# Altium footprint library SparkFun.PCBLIB: 674 footprints (part 25 of 44)
Each footprint in its own frame and in the unit in brackets; x right, y up, seen from the top. Pads: shape width x height; smd on the part's side, far side on the other; paste and mask are expansions set on the pad; w line width, h text height; cw(c..) or ccw(c..) is an arc to the next point about the centre after c.
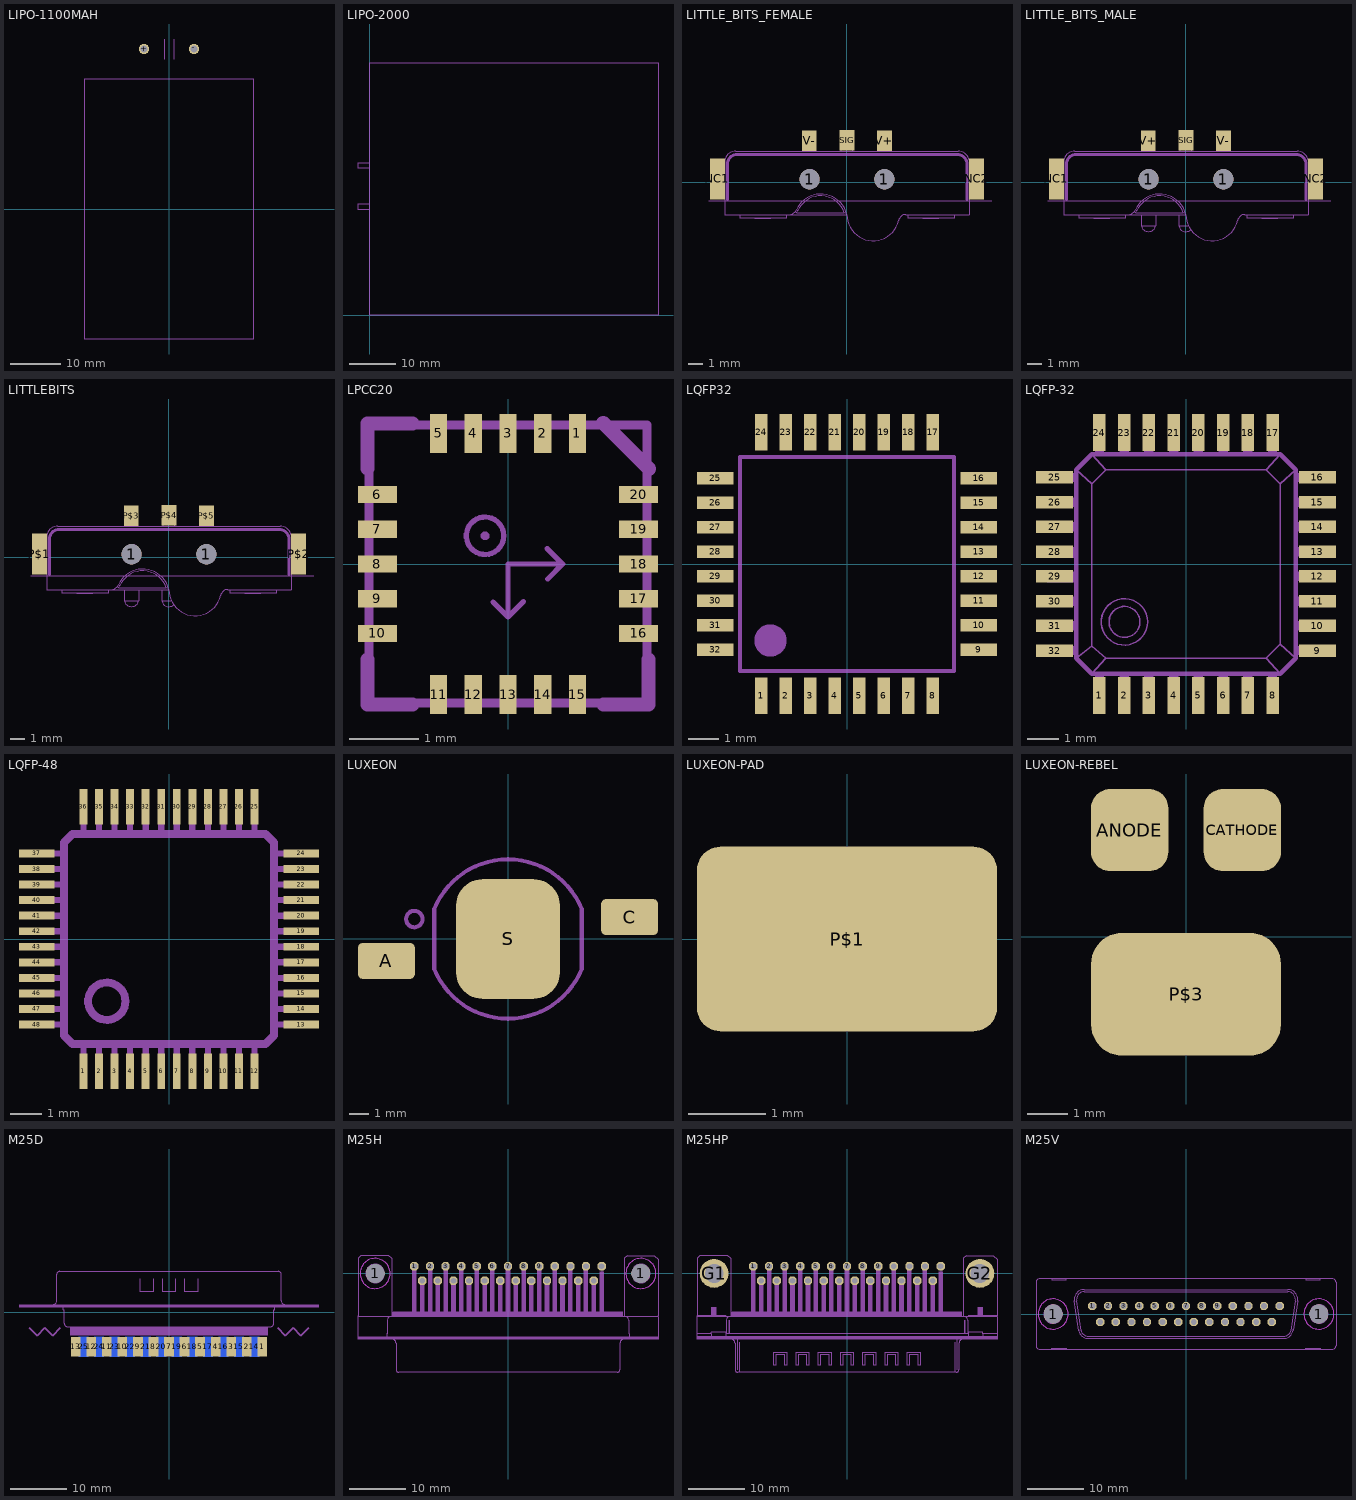
[diagram p24: the footprints below, top view; thin cyan lines are the x and y axes]

## LIPO-1100MAH [mil]
pads (2):
  round 82.5 hole 55: +(-196.85,1259.84) -(196.85,1259.84)
Mechanical 18:
  lines w5: -39.37,1181.1 -39.37,1338.58 ; 39.37,1181.1 39.37,1338.58
  lines w8: -669.29,-1023.62 669.29,-1023.62 669.29,1023.62 -669.29,1023.62 -669.29,-1023.62

## LIPO-2000 [mil]
Mechanical 18:
  lines w5: 0,900 0,0 2450,0 2450,2150 0,2150 0,1300 ; 0,900 0,950 ; 0,900 -100,900 -100,950 0,950 ; 0,950 0,1250 ; 0,1250 0,1300 ; 0,1250 -100,1250 -100,1300 0,1300

## LITTLE_BITS_FEMALE [mil]
pads (7):
  round 54.09 hole 54.09: 1(-99,8.5) 1(101,8.5)
  rect 40x109 smd: NC1(-346,9.5) NC2(348,9.5)
  rect 40x55 smd: SIG(1,112.5) V+(101,111.5) V-(-100,111.5)
Mechanical 2:
  lines w8: -319,-45.5 -319,49.5 cw(c-294,49.5) -294,74.5 297,74.5 cw(c297,49.5) 322,49.5 322,-45.5
Mechanical 18:
  circle w1: c-99.19,9.03 r25
  circle w1: c-99.19,9.03 r15
  circle w1: c100.82,9.03 r25
  circle w1: c100.82,9.03 r15
  lines w0: -369,-49.5 389,-49.5 ; -326.69,59.03 -326.69,-40.97 ; -286.69,-85.97 -286.69,-95.97 -161.69,-95.97 -161.69,-85.97 ; -245.85,-95.97 -245.85,-96.97 -204.19,-96.97 -204.19,-95.97 ; -236.48,-96.97 -236.48,-95.97 ; -210.43,-96.97 -210.43,-95.97 ; -137.44,-77.97 -133.44,-80.97 ; -114.19,84.03 -114.19,134.03 -84.19,134.03 -84.19,84.03 ; -14.19,84.03 -14.19,134.03 15.82,134.03 15.82,84.03 ; -1.41,-79.42 -5.87,-80.97 ; 0.83,-85.97 0.82,-85.97 ; 85.82,84.03 85.82,134.03 115.82,134.03 115.82,84.03 ; 328.32,-40.97 363.32,-40.97 363.32,-3.47 cw(c363.32,9.03) 363.32,21.53 363.32,59.03 328.32,59.03 ; -326.69,-40.97 -326.69,-85.97 -153.44,-85.97 ; -326.69,-40.97 -361.69,-40.97 -361.69,-3.47 ccw(c-361.69,9.03) -361.69,21.53 -361.69,59.03 -326.26,59.03 cw(c-296.68,54.04) -296.69,84.03 115.82,84.03 ; -153.44,-85.97 -18.69,-85.97 0.82,-85.97 ; -153.44,-85.97 ccw(c-153.44,-65.97) -135.13,-74.02 ; -135.13,-74.02 -130.56,-76.03 ; -135.13,-74.02 -135.14,-74.02 ; -135.14,-74.02 cw(c-69.18,-103.02) 0.82,-85.97 ; -133.44,-80.97 -5.87,-80.97 ; -133.44,-80.97 ccw(c-153.44,-66) -130.56,-76.03 ; -130.56,-76.03 cw(c-69.19,-103.02) -5.87,-80.97 ; 0.82,-85.97 ccw(c70.81,-85.97) 139.06,-101.52 cw(c158.57,-105.97) 158.57,-85.97 163.32,-85.97 ; 115.82,84.03 298.32,84.03 cw(c298.31,54.03) 327.9,59.03 328.32,59.03 ; 163.32,-85.97 288.32,-85.97 ; 163.32,-85.97 163.32,-95.97 204.15,-95.97 ; 204.15,-95.97 213.52,-95.97 ; 204.15,-95.97 204.15,-96.97 213.52,-96.97 ; 213.52,-96.97 239.57,-96.97 ; 213.52,-96.97 213.52,-95.97 ; 213.52,-95.97 239.57,-95.97 ; 239.57,-96.97 245.82,-96.97 245.82,-95.97 ; 239.57,-96.97 239.57,-95.97 ; 239.57,-95.97 245.82,-95.97 ; 245.82,-95.97 288.32,-95.97 288.32,-85.97 ; 288.32,-85.97 328.32,-85.97 328.32,59.03

## LITTLE_BITS_MALE [mil]
pads (7):
  round 54.09 hole 54.09: 1(-99,8.5) 1(101,8.5)
  rect 40x109 smd: NC1(-346,9.5) NC2(348,9.5)
  rect 40x55 smd: SIG(1,112.5) V+(-100,111.5) V-(101,111.5)
Mechanical 2:
  lines w8: -319,-45.5 -319,49.5 cw(c-294,49.5) -294,74.5 297,74.5 cw(c297,49.5) 322,49.5 322,-45.5
Mechanical 18:
  circle w1: c-99.19,9.03 r25
  circle w1: c-99.19,9.03 r15
  circle w1: c100.82,9.03 r25
  circle w1: c100.82,9.03 r15
  lines w0: -369,-49.5 389,-49.5 ; -326.69,59.03 -326.69,-40.97 ; -286.69,-85.97 -286.69,-95.97 -161.69,-95.97 -161.69,-85.97 ; -245.85,-95.97 -245.85,-96.97 -204.19,-96.97 -204.19,-95.97 ; -236.48,-96.97 -236.48,-95.97 ; -210.43,-96.97 -210.43,-95.97 ; -137.44,-77.97 -133.44,-80.97 ; -118.69,-85.97 -118.69,-115.97 ; -114.19,84.03 -114.19,134.03 -84.19,134.03 -84.19,84.03 ; -79.69,-85.97 -79.69,-115.97 ; -14.19,84.03 -14.19,134.03 15.82,134.03 15.82,84.03 ; -1.41,-79.42 -5.87,-80.97 ; 0.83,-85.97 0.82,-85.97 ; 7.64,-115.97 -18.69,-115.97 ; 13.94,-126.62 cw(c0.81,-111.52) -18.69,-115.97 ; 85.82,84.03 85.82,134.03 115.82,134.03 115.82,84.03 ; 328.32,-40.97 363.32,-40.97 363.32,-3.47 cw(c363.32,9.03) 363.32,21.53 363.32,59.03 328.32,59.03 ; -326.69,-40.97 -326.69,-85.97 -153.44,-85.97 ; -326.69,-40.97 -361.69,-40.97 -361.69,-3.47 ccw(c-361.69,9.03) -361.69,21.53 -361.69,59.03 -326.26,59.03 cw(c-296.68,54.04) -296.69,84.03 115.82,84.03 ; -153.44,-85.97 -18.69,-85.97 ; -153.44,-85.97 ccw(c-153.44,-65.97) -135.13,-74.02 ; -135.13,-74.02 -130.56,-76.03 ; -135.13,-74.02 -135.14,-74.02 ; -135.14,-74.02 cw(c-69.18,-103.02) 0.82,-85.97 ; -133.44,-80.97 -5.87,-80.97 ; -133.44,-80.97 ccw(c-153.44,-66) -130.56,-76.03 ; -130.56,-76.03 cw(c-69.19,-103.02) -5.87,-80.97 ; -118.69,-115.97 -79.69,-115.97 ; -118.69,-115.97 ccw(c-99.19,-111.53) -79.69,-115.97 ; -18.69,-115.97 -18.69,-85.97 ; -18.69,-85.97 0.82,-85.97 ; 0.82,-85.97 ccw(c70.81,-85.97) 139.06,-101.52 cw(c158.57,-105.97) 158.57,-85.97 163.32,-85.97 ; 115.82,84.03 298.32,84.03 cw(c298.31,54.03) 327.9,59.03 328.32,59.03 ; 163.32,-85.97 288.32,-85.97 ; 163.32,-85.97 163.32,-95.97 204.15,-95.97 ; 204.15,-95.97 213.52,-95.97 ; 204.15,-95.97 204.15,-96.97 213.52,-96.97 ; 213.52,-96.97 239.57,-96.97 ; 213.52,-96.97 213.52,-95.97 ; 213.52,-95.97 239.57,-95.97 ; 239.57,-96.97 245.82,-96.97 245.82,-95.97 ; 239.57,-96.97 239.57,-95.97 ; 239.57,-95.97 245.82,-95.97 ; 245.82,-95.97 288.32,-95.97 288.32,-85.97 ; 288.32,-85.97 328.32,-85.97 328.32,59.03

## LITTLEBITS [mil]
pads (7):
  round 54.09 hole 54.09: 1(-99,8.5) 1(101,8.5)
  rect 40x109 smd: P$1(-346,9.5) P$2(348,9.5)
  rect 40x55 smd: P$3(-100,111.5) P$4(1,112.5) P$5(101,111.5)
Mechanical 2:
  lines w8: -319,-45.5 -319,49.5 cw(c-294,49.5) -294,74.5 297,74.5 cw(c297,49.5) 322,49.5 322,-45.5
Mechanical 18:
  circle w1: c-99.19,9.03 r25
  circle w1: c-99.19,9.03 r15
  circle w1: c100.82,9.03 r25
  circle w1: c100.82,9.03 r15
  lines w0: -369,-49.5 389,-49.5 ; -326.69,59.03 -326.69,-40.97 ; -286.69,-85.97 -286.69,-95.97 -161.69,-95.97 -161.69,-85.97 ; -245.85,-95.97 -245.85,-96.97 -204.19,-96.97 -204.19,-95.97 ; -236.48,-96.97 -236.48,-95.97 ; -210.43,-96.97 -210.43,-95.97 ; -137.44,-77.97 -133.44,-80.97 ; -118.69,-85.97 -118.69,-115.97 ; -114.19,84.03 -114.19,134.03 -84.19,134.03 -84.19,84.03 ; -79.69,-85.97 -79.69,-115.97 ; -14.19,84.03 -14.19,134.03 15.82,134.03 15.82,84.03 ; -1.41,-79.42 -5.87,-80.97 ; 0.83,-85.97 0.82,-85.97 ; 7.64,-115.97 -18.69,-115.97 ; 13.94,-126.62 cw(c0.81,-111.52) -18.69,-115.97 ; 85.82,84.03 85.82,134.03 115.82,134.03 115.82,84.03 ; 328.32,-40.97 363.32,-40.97 363.32,-3.47 cw(c363.32,9.03) 363.32,21.53 363.32,59.03 328.32,59.03 ; -326.69,-40.97 -326.69,-85.97 -153.44,-85.97 ; -326.69,-40.97 -361.69,-40.97 -361.69,-3.47 ccw(c-361.69,9.03) -361.69,21.53 -361.69,59.03 -326.26,59.03 cw(c-296.68,54.04) -296.69,84.03 115.82,84.03 ; -153.44,-85.97 -18.69,-85.97 ; -153.44,-85.97 ccw(c-153.44,-65.97) -135.13,-74.02 ; -135.13,-74.02 -130.56,-76.03 ; -135.13,-74.02 -135.14,-74.02 ; -135.14,-74.02 cw(c-69.18,-103.02) 0.82,-85.97 ; -133.44,-80.97 -5.87,-80.97 ; -133.44,-80.97 ccw(c-153.44,-66) -130.56,-76.03 ; -130.56,-76.03 cw(c-69.19,-103.02) -5.87,-80.97 ; -118.69,-115.97 -79.69,-115.97 ; -118.69,-115.97 ccw(c-99.19,-111.53) -79.69,-115.97 ; -18.69,-115.97 -18.69,-85.97 ; -18.69,-85.97 0.82,-85.97 ; 0.82,-85.97 ccw(c70.81,-85.97) 139.06,-101.52 cw(c158.57,-105.97) 158.57,-85.97 163.32,-85.97 ; 115.82,84.03 298.32,84.03 cw(c298.31,54.03) 327.9,59.03 328.32,59.03 ; 163.32,-85.97 288.32,-85.97 ; 163.32,-85.97 163.32,-95.97 204.15,-95.97 ; 204.15,-95.97 213.52,-95.97 ; 204.15,-95.97 204.15,-96.97 213.52,-96.97 ; 213.52,-96.97 239.57,-96.97 ; 213.52,-96.97 213.52,-95.97 ; 213.52,-95.97 239.57,-95.97 ; 239.57,-96.97 245.82,-96.97 245.82,-95.97 ; 239.57,-96.97 239.57,-95.97 ; 239.57,-95.97 245.82,-95.97 ; 245.82,-95.97 288.32,-95.97 288.32,-85.97 ; 288.32,-85.97 328.32,-85.97 328.32,59.03

## LPCC20 [mm]
pads (20):
  rect 0.25x0.56 smd: 1(1,1.88) 2(0.5,1.88) 3(0,1.88) 4(-0.5,1.88) 5(-1,1.88) 11(-1,-1.88) 12(-0.5,-1.88) 13(0,-1.88) 14(0.5,-1.88) 15(1,-1.88)
  rect 0.56x0.25 smd: 6(-1.88,1) 7(-1.88,0.5) 8(-1.88,0) 9(-1.88,-0.5) 10(-1.88,-1) 16(1.88,-1) 17(1.88,-0.5) 18(1.88,0) 19(1.88,0.5) 20(1.88,1)
Mechanical 2:
  lines w0.203: -2.024,-1.375 -2.024,-2.024 -1.373,-2.024 ; -2.024,1.375 -2.024,2.024 -1.375,2.024 ; 1.372,2.032 2.032,1.372 ; 1.375,-2.024 2.024,-2.024 2.024,-1.375
Mechanical 18:
  circle w0.076: c-0.33,0.406 r0.27
  circle w0.076: c-0.33,0.406 r0.025
  lines w0.076: -0.216,-0.546 0,-0.762 ; 0.223,-0.539 0,-0.762 ; 0.564,0.223 0.787,0 ; 0.572,-0.215 0.787,0 ; 0,-0.762 0,0 0.787,0
  lines w0.127: -2,-2 2,-2 2,2 -2,2 -2,-2

## LQFP32 [mm]
pads (32):
  rect 0.4x1.2 smd: 1(-2.8,-4.3) 2(-2,-4.3) 3(-1.2,-4.3) 4(-0.4,-4.3) 5(0.4,-4.3) 6(1.2,-4.3) 7(2,-4.3) 8(2.8,-4.3) 17(2.8,4.3) 18(2,4.3) 19(1.2,4.3) 20(0.4,4.3) 21(-0.4,4.3) 22(-1.2,4.3) 23(-2,4.3) 24(-2.8,4.3)
  rect 1.2x0.4 smd: 9(4.3,-2.8) 10(4.3,-2) 11(4.3,-1.2) 12(4.3,-0.4) 13(4.3,0.4) 14(4.3,1.2) 15(4.3,2) 16(4.3,2.8) 25(-4.3,2.8) 26(-4.3,2) 27(-4.3,1.2) 28(-4.3,0.4) 29(-4.3,-0.4) 30(-4.3,-1.2) 31(-4.3,-2) 32(-4.3,-2.8)
Mechanical 2:
  lines w0.127: -3.5,-3.5 -3.5,3.5 3.5,3.5 3.5,-3.5 -3.5,-3.5
Mechanical 6:
  circle w0.61: c-2.5,-2.5 r0.224

## LQFP-32 [mm]
pads (32):
  rect 0.4x1.2 smd: 1(-2.8,-4.25) 2(-2,-4.25) 3(-1.2,-4.25) 4(-0.4,-4.25) 5(0.4,-4.25) 6(1.2,-4.25) 7(2,-4.25) 8(2.8,-4.25) 17(2.8,4.25) 18(2,4.25) 19(1.2,4.25) 20(0.4,4.25) 21(-0.4,4.25) 22(-1.2,4.25) 23(-2,4.25) 24(-2.8,4.25)
  rect 1.2x0.4 smd: 9(4.25,-2.8) 10(4.25,-2) 11(4.25,-1.2) 12(4.25,-0.4) 13(4.25,0.4) 14(4.25,1.2) 15(4.25,2) 16(4.25,2.8) 25(-4.25,2.8) 26(-4.25,2) 27(-4.25,1.2) 28(-4.25,0.4) 29(-4.25,-0.4) 30(-4.25,-1.2) 31(-4.25,-2) 32(-4.25,-2.8)
Mechanical 2:
  circle w0.051: c-1.99,-1.871 r0.75
  circle w0.051: c-1.99,-1.871 r0.5
  lines w0.051: -3.55,-3.05 -3.05,-2.65 ; -3.55,3.05 -3.05,2.59 ; -3.05,-3.55 -2.59,-3.05 ; -3.05,3.55 -2.59,3.05 ; 3.05,-3.55 2.59,-3.05 ; 3.05,3.55 2.59,3.05 ; 3.55,-3.05 3.05,-2.59 ; 3.55,3.05 3.05,2.59 ; -3.05,-2.65 -3.05,2.59 ; -3.05,-2.65 -2.59,-3.05 ; -3.05,2.59 -2.59,3.05 ; -2.59,-3.05 2.59,-3.05 ; -2.59,3.05 2.59,3.05 ; 2.59,-3.05 3.05,-2.59 ; 2.59,3.05 3.05,2.59 ; 3.05,-2.59 3.05,2.59
  lines w0.152: -3.55,-3.05 -3.05,-3.55 3.05,-3.55 3.55,-3.05 3.55,3.05 3.05,3.55 -3.05,3.55 -3.55,3.05 -3.55,-3.05
Mechanical 18:
  rectangle: -2.95,3.55 -2.65,4.5
  rectangle: -2.15,3.55 -1.85,4.5
  rectangle: -1.35,3.55 -1.05,4.5
  rectangle: -0.55,3.55 -0.25,4.5
  rectangle: 0.25,3.55 0.55,4.5
  rectangle: 1.05,3.55 1.35,4.5
  rectangle: 1.85,3.55 2.15,4.5
  rectangle: 2.65,3.55 2.95,4.5
  rectangle: 3.55,2.65 4.5,2.95
  rectangle: 3.55,1.85 4.5,2.15
  rectangle: 3.55,1.05 4.5,1.35
  rectangle: 3.55,0.25 4.5,0.55
  rectangle: 3.55,-0.55 4.5,-0.25
  rectangle: 3.55,-1.35 4.5,-1.05
  rectangle: 3.55,-2.15 4.5,-1.85
  rectangle: 3.55,-2.95 4.5,-2.65
  rectangle: 2.65,-4.5 2.95,-3.55
  rectangle: 1.85,-4.5 2.15,-3.55
  rectangle: 1.05,-4.5 1.35,-3.55
  rectangle: 0.25,-4.5 0.55,-3.55
  rectangle: -0.55,-4.5 -0.25,-3.55
  rectangle: -1.35,-4.5 -1.05,-3.55
  rectangle: -2.15,-4.5 -1.85,-3.55
  rectangle: -2.95,-4.5 -2.65,-3.55
  rectangle: -4.5,-2.95 -3.55,-2.65
  rectangle: -4.5,-2.15 -3.55,-1.85
  rectangle: -4.5,-1.35 -3.55,-1.05
  rectangle: -4.5,-0.6 -3.55,-0.25
  rectangle: -4.5,0.2 -3.55,0.55
  rectangle: -4.5,1.05 -3.55,1.35
  rectangle: -4.5,1.85 -3.55,2.15
  rectangle: -4.5,2.65 -3.55,2.95

## LQFP-48 [mil]
pads (48):
  rect 10x45 smd: 1(-108.27,-167.32) 2(-88.58,-167.32) 3(-68.9,-167.32) 4(-49.21,-167.32) 5(-29.53,-167.32) 6(-9.84,-167.32) 7(9.84,-167.32) 8(29.53,-167.32) 9(49.21,-167.32) 10(68.9,-167.32) 11(88.58,-167.32) 12(108.27,-167.32) 25(108.27,167.32) 26(88.58,167.32) 27(68.9,167.32) 28(49.21,167.32) 29(29.53,167.32) 30(9.84,167.32) 31(-9.84,167.32) 32(-29.53,167.32) 33(-49.21,167.32) 34(-68.9,167.32) 35(-88.58,167.32) 36(-108.27,167.32)
  rect 45x10 smd: 13(167.32,-108.27) 14(167.32,-88.58) 15(167.32,-68.9) 16(167.32,-49.21) 17(167.32,-29.53) 18(167.32,-9.84) 19(167.32,9.84) 20(167.32,29.53) 21(167.32,49.21) 22(167.32,68.9) 23(167.32,88.58) 24(167.32,108.27) 37(-167.32,108.27) 38(-167.32,88.58) 39(-167.32,68.9) 40(-167.32,49.21) 41(-167.32,29.53) 42(-167.32,9.84) 43(-167.32,-9.84) 44(-167.32,-29.53) 45(-167.32,-49.21) 46(-167.32,-68.9) 47(-167.32,-88.58) 48(-167.32,-108.27)
Mechanical 2:
  circle w10: c-78.74,-78.74 r23.62
  lines w10: -132.87,-122.05 -122.05,-132.87 122.05,-132.87 132.87,-122.05 132.87,122.05 122.05,132.87 -122.05,132.87 -132.87,122.05 -132.87,-122.05
Mechanical 18:
  rectangle: -112.2,-177.17 -104.33,-135.83
  rectangle: -92.52,-177.17 -84.65,-135.83
  rectangle: -72.83,-177.17 -64.96,-135.83
  rectangle: -53.15,-177.17 -45.28,-135.83
  rectangle: -33.46,-177.17 -25.59,-135.83
  rectangle: -13.78,-177.17 -5.91,-135.83
  rectangle: 5.91,-177.17 13.78,-135.83
  rectangle: 25.59,-177.17 33.46,-135.83
  rectangle: 45.28,-177.17 53.15,-135.83
  rectangle: 64.96,-177.17 72.83,-135.83
  rectangle: 84.65,-177.17 92.52,-135.83
  rectangle: 104.33,-177.17 112.2,-135.83
  rectangle: 135.83,-112.2 177.17,-104.33
  rectangle: 135.83,-92.52 177.17,-84.65
  rectangle: 135.83,-72.83 177.17,-64.96
  rectangle: 135.83,-53.15 177.17,-45.28
  rectangle: 135.83,-33.46 177.17,-25.59
  rectangle: 135.83,-13.78 177.17,-5.91
  rectangle: 135.83,5.91 177.17,13.78
  rectangle: 135.83,25.59 177.17,33.46
  rectangle: 135.83,45.28 177.17,53.15
  rectangle: 135.83,64.96 177.17,72.83
  rectangle: 135.83,84.65 177.17,92.52
  rectangle: 135.83,104.33 177.17,112.2
  rectangle: 104.33,135.83 112.2,177.17
  rectangle: 84.65,135.83 92.52,177.17
  rectangle: 64.96,135.83 72.83,177.17
  rectangle: 45.28,135.83 53.15,177.17
  rectangle: 25.59,135.83 33.46,177.17
  rectangle: 5.91,135.83 13.78,177.17
  rectangle: -13.78,135.83 -5.91,177.17
  rectangle: -33.46,135.83 -25.59,177.17
  rectangle: -53.15,135.83 -45.28,177.17
  rectangle: -72.83,135.83 -64.96,177.17
  rectangle: -92.52,135.83 -84.65,177.17
  rectangle: -112.2,135.83 -104.33,177.17
  rectangle: -177.17,104.33 -135.83,112.2
  rectangle: -177.17,84.65 -135.83,92.52
  rectangle: -177.17,64.96 -135.83,72.83
  rectangle: -177.17,45.28 -135.83,53.15
  rectangle: -177.17,25.59 -135.83,33.46
  rectangle: -177.17,5.91 -135.83,13.78
  rectangle: -177.17,-13.78 -135.83,-5.91
  rectangle: -177.17,-33.46 -135.83,-25.59
  rectangle: -177.17,-53.15 -135.83,-45.28
  rectangle: -177.17,-72.83 -135.83,-64.96
  rectangle: -177.17,-92.52 -135.83,-84.65
  rectangle: -177.17,-112.2 -135.83,-104.33

## LUXEON [mm]
pads (3):
  rrect25% 2.85x1.8 smd: A(-6.1,-1.1) C(6.1,1.1)
  rrect50% 5.2x6 smd: S(0,0)
Mechanical 2:
  circle w0.203: c-4.7,1 r0.412
  lines w0.203: -3.7,-1.5 -3.7,1.5 cw(c0.008,0) 0,4 cw(c-0.008,0) 3.7,1.5 3.7,-1.5 cw(c-0.008,0) 0,-4 cw(c0.008,0) -3.7,-1.5

## LUXEON-PAD [mil]
pads (1):
  rrect25% 153.54x94.49 smd: P$1(0,0)

## LUXEON-REBEL [mil]
pads (3):
  rrect50% 75.2x79.92 smd: ANODE(-54.72,103.54) CATHODE(54.72,103.54)
  rrect50% 184.25x119.29 smd: P$3(0,-55.91)

## M25D [mil]
pads (25):
  rect 66.93x137.8 smd paste-68.9: 1(648.01,-237.98) 2(540,-237.99) 3(431.99,-237.98) 4(324.01,-237.98) 5(215.99,-237.98) 6(108.01,-237.98) 7(0,-237.99) 8(-108.01,-237.98) 9(-215.99,-237.98) 10(-324.01,-237.98) 11(-431.99,-237.98) 12(-540,-237.99) 13(-648.01,-237.98)
  rect 66.93x137.8 smd far side paste-68.9: 14(594,-238) 15(486,-238) 16(378,-238) 17(270,-238) 18(162,-238) 19(54,-238) 20(-54,-238) 21(-162,-238) 22(-270,-238) 23(-378,-238) 24(-486,-238) 25(-594,-238)
Mechanical 18:
  rectangle: -1043.31,35.43 1043.31,55.12
  rectangle: -688.98,-161.42 688.98,-98.43
  lines w6: -805,55.55 ccw(c-805,80.55) -780,80.55 -780,265.55 cw(c-760,265.55) -760,285.55 760,285.55 cw(c760,265.55) 780,265.55 780,80.55 ccw(c805,80.55) 805,55.55 ; -734,40 -734,20 -729,20 -729,-75 ccw(c-704,-75) -704,-100 ; -704.76,-100 704,-100 ; -200,234.45 -200,144.45 -110,144.45 -110,234.45 ; -45,234.45 -45,144.45 45,144.45 45,234.45 ; 110,234.45 110,144.45 200,144.45 200,234.45 ; 704.76,-100 704,-100 ; 734,40 734,20 729,20 729,-75 cw(c704,-75) 704,-100
Mechanical 19:
  lines w10: -972,-108 -918,-162 -864,-108 -810,-162 -756,-108 ; 756,-108 810,-162 864,-108 918,-162 972,-108

## M25H [mil]
pads (27):
  round 130 hole 130: 1(-926,0) 1(926,0)
  oct 58.09x58.09 hole 40: 1(-652,50) 2(-543,50) 3(-435,50) 4(-326,50) 5(-217,50) 6(-109,50) 7(0,50) 8(109,50) 9(217,50) 10(326,50) 11(435,50) 12(543,50) 13(652,50) 14(-598,-50) 15(-489,-50) 16(-380,-50) 17(-272,-50) 18(-163,-50) 19(-54,-50) 20(54,-50) 21(163,-50) 22(272,-50) 23(380,-50) 24(489,-50) 25(598,-50)
Mechanical 2:
  circle w6: c926,0 r65
  circle w6: c-926,0 r65
  rectangle: -1045,-460 1045,-440
  rectangle: -800,-300 800,-270
  rectangle: -668,-270 -636,15
  rectangle: -614,-270 -582,-85
  rectangle: -559,-270 -527,15
  rectangle: -505,-270 -473,-85
  rectangle: -451,-270 -419,15
  rectangle: -396,-270 -364,-85
  rectangle: -342,-270 -310,15
  rectangle: -288,-270 -256,-85
  rectangle: -233,-270 -201,15
  rectangle: -179,-270 -147,-85
  rectangle: -125,-270 -93,15
  rectangle: -70,-270 -38,-85
  rectangle: -16,-270 16,15
  rectangle: 38,-270 70,-85
  rectangle: 93,-270 125,15
  rectangle: 147,-270 179,-85
  rectangle: 201,-270 233,15
  rectangle: 256,-270 288,-85
  rectangle: 310,-270 342,15
  rectangle: 364,-270 396,-85
  rectangle: 419,-270 451,15
  rectangle: 473,-270 505,-85
  rectangle: 527,-270 559,15
  rectangle: 582,-270 614,-85
  rectangle: 636,-270 668,15
  lines w6: -845,-440 -845,-420 -840,-420 -840,-325 cw(c-815,-325) -815,-300 ; -805,-460 cw(c-805,-485) -780,-485 -780,-670 ccw(c-760,-670) -760,-690 -750,-690 750,-690 760,-690 ccw(c760,-670) 780,-670 780,-485 cw(c805,-485) 805,-460 ; 815,-300 cw(c815,-325) 840,-325 840,-420 845,-420 845,-440 ; -1045,-300 -1045,-420 -1045,-440 -1045,-460 -765,-460 765,-460 1045,-460 1045,-440 1045,-420 1045,-300 ; -1045,-300 -1045,-295 -1045,105 -1025,125 -830,125 -810,105 -810,-300 ; -1045,-300 -845,-300 -810,-300 ; -810,-300 -800,-300 ; -800,-300 800,-300 ; -800,-300 -800,-270 800,-270 800,-300 ; 800,-300 810,-300 ; 810,-300 845,-300 1045,-300 ; 810,-300 810,105 830,125 1020,125 1045,100 1045,-295 1045,-300
Mechanical 11 keep-out:
  circle w0: c926,0 r105
  circle w0: c-926,0 r105
Mechanical 12:
  circle w0: c926,0 r105
  circle w0: c-926,0 r105
Mechanical 18:
  lines w6: 652,5 652,45
  lines w32: -652,5 -652,45 ; -598,-94 -598,-54 ; -543,5 -543,45 ; -489,-94 -489,-54 ; -435,5 -435,45 ; -380,-94 -380,-54 ; -326,5 -326,45 ; -272,-95 -272,-55 ; -217,5 -217,45 ; -163,-95 -163,-55 ; -109,5 -109,45 ; -54,-95 -54,-55 ; 0,5 0,45 ; 54,-95 54,-55 ; 109,5 109,45 ; 163,-95 163,-55 ; 217,5 217,45 ; 272,-95 272,-55 ; 326,5 326,45 ; 380,-95 380,-55 ; 435,5 435,45 ; 489,-95 489,-55 ; 543,5 543,45 ; 598,-95 598,-55

## M25HP [mil]
pads (27):
  oct 58.09x58.09 hole 40: 1(-652,50) 2(-543,50) 3(-435,50) 4(-326,50) 5(-217,50) 6(-109,50) 7(0,50) 8(109,50) 9(217,50) 10(326,50) 11(435,50) 12(543,50) 13(652,50) 14(-598,-50) 15(-489,-50) 16(-380,-50) 17(-272,-50) 18(-163,-50) 19(-54,-50) 20(54,-50) 21(163,-50) 22(272,-50) 23(380,-50) 24(489,-50) 25(598,-50)
  round 200 hole 130: G1(-926,0) G2(926,0)
Mechanical 2:
  drawing of 161 lines, arcs and shapes, not listed
Mechanical 18:
  lines w6: 652,5 652,45
  lines w32: -652,5 -652,45 ; -598,-94 -598,-54 ; -543,5 -543,45 ; -489,-94 -489,-54 ; -435,5 -435,45 ; -380,-94 -380,-54 ; -326,5 -326,45 ; -272,-95 -272,-55 ; -217,5 -217,45 ; -163,-95 -163,-55 ; -109,5 -109,45 ; -54,-95 -54,-55 ; 0,5 0,45 ; 54,-95 54,-55 ; 109,5 109,45 ; 163,-95 163,-55 ; 217,5 217,45 ; 272,-95 272,-55 ; 326,5 326,45 ; 380,-95 380,-55 ; 435,5 435,45 ; 489,-95 489,-55 ; 543,5 543,45 ; 598,-95 598,-55

## M25V [mil]
pads (27):
  round 130 hole 130: 1(-926,0) 1(926,0)
  oct 58.09x58.09 hole 40: 1(-652,56) 2(-543,56) 3(-435,56) 4(-326,56) 5(-217,56) 6(-109,56) 7(0,56) 8(109,56) 9(217,56) 10(326,56) 11(435,56) 12(543,56) 13(652,56) 14(-598,-56) 15(-489,-56) 16(-380,-56) 17(-272,-56) 18(-163,-56) 19(-54,-56) 20(54,-56) 21(163,-56) 22(272,-56) 23(380,-56) 24(489,-56) 25(598,-56)
Mechanical 2:
  circle w6: c-926,-1 r65
  circle w6: c926,0 r65
  lines w6: -777,92 -746,-116 ; -776.68,88.67 cw(c-710,102) -710,170 710,170 cw(c710,101.99) 776.69,88.67 ; -762,92 -731,-116 ; -761.97,91.61 cw(c-710,102) -710,155 710,155 cw(c710,101.99) 761.79,90.7 ; -747.4,-110.99 ccw(c-680,-102) -680,-170 680,-170 ccw(c679.99,-102) 747.89,-105.7 ; -731.3,-115.33 ccw(c-680,-101.99) -680,-155 680,-155 ccw(c679.99,-102) 731.52,-114.37 ; 731,-115 762,91 ; 747,-113 777,91 ; -935,-245 -935,-240 -835,-240 -835,-245 ; -935,-245 -835,-245 ; -935,-245 -1020,-245 cw(c-1020,-220) -1045,-220 -1045,220 cw(c-1020,220) -1020,245 -935,245 ; -935,245 -935,240 -835,240 -835,245 ; -935,245 -835,245 ; -835,-245 835,-245 ; -835,245 835,245 ; 835,-245 835,-240 935,-240 935,-245 ; 835,-245 935,-245 ; 835,245 835,240 935,240 935,245 ; 835,245 935,245 ; 935,-245 1020,-245 ccw(c1020,-220) 1045,-220 1045,220 ccw(c1020,220) 1020,245 935,245
Mechanical 11 keep-out:
  circle w0: c926,0 r105
  circle w0: c-926,0 r105
Mechanical 12:
  circle w0: c926,0 r105
  circle w0: c-926,0 r105
Mechanical 18:
  circle w16: c-109,56 r10
  circle w16: c-163,-56 r10
  circle w16: c-217,56 r10
  circle w16: c0,56 r10
  circle w16: c-54,-56 r10
  circle w16: c54,-56 r10
  circle w16: c109,56 r10
  circle w16: c217,56 r10
  circle w16: c163,-56 r10
  circle w16: c272,-56 r10
  circle w16: c326,56 r10
  circle w16: c380,-56 r10
  circle w16: c435,56 r10
  circle w16: c489,-56 r10
  circle w16: c543,56 r10
  circle w16: c652,56 r10
  circle w16: c598,-56 r10
  circle w16: c-326,56 r10
  circle w16: c-272,-56 r10
  circle w16: c-380,-56 r10
  circle w16: c-435,56 r10
  circle w16: c-543,56 r10
  circle w16: c-652,56 r10
  circle w16: c-489,-56 r10
  circle w16: c-598,-56 r10